# Altium footprint library Footprints.PcbLib: 196 footprints (part 7 of 13)
Each footprint in its own frame and in the unit in brackets; x right, y up, seen from the top. Pads: shape width x height; smd on the part's side, far side on the other; paste and mask are expansions set on the pad; w line width, h text height; cw(c..) or ccw(c..) is an arc to the next point about the centre after c.
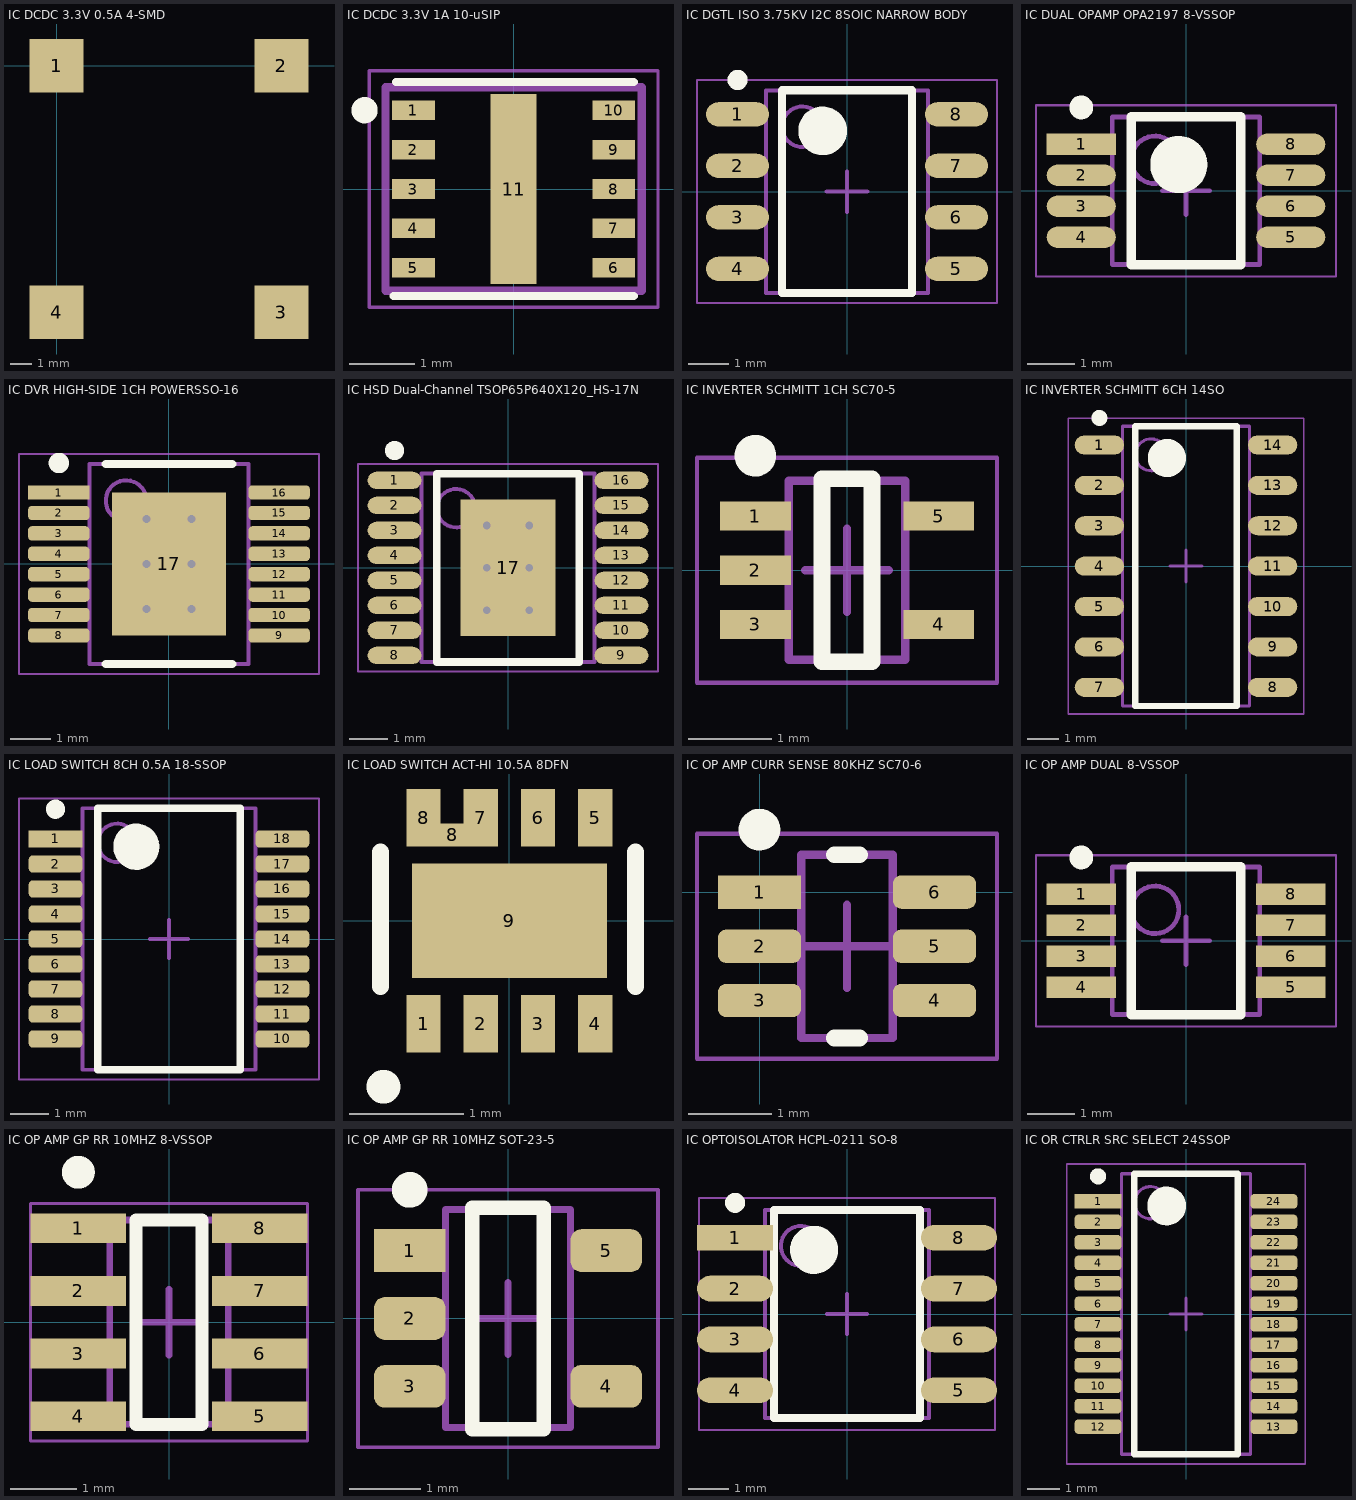
[diagram p6: the footprints below, top view; thin cyan lines are the x and y axes]

## IC DCDC 3.3V 0.5A 4-SMD [mm] "ROF-78E3.3-0.5SMD-R"
height 4
pads (4):
  rect 2.5x2.5 smd: 1(0,0) 2(10.5,0) 3(10.5,-11.5) 4(0,-11.5)
3D body: height 4, standoff 0, extent -1,-12.5 11.5,1

## IC DCDC 3.3V 1A 10-uSIP [mm] "LMZM23601"
pads (11):
  rect 0.65x0.3 smd: 1(-1.525,1.2) 2(-1.525,0.6) 3(-1.525,0) 4(-1.525,-0.6) 5(-1.525,-1.2) 6(1.525,-1.2) 7(1.525,-0.6) 8(1.525,0) 9(1.525,0.6) 10(1.525,1.2)
  rect 0.7x2.9 smd: 11(0,0)
Top Overlay:
  circle w0.2: c-2.27,1.2 r0.1
  lines w0.127: -1.83,-1.63 1.83,-1.63 ; -1.79,1.63 1.83,1.63
Top Paste:
  region: -0.35,-0.416 -0.35,0.416 0.35,0.416 0.35,-0.416
  region: 0.35,-0.617 0.35,-1.45 -0.35,-1.45 -0.35,-0.617
  region: -0.35,0.617 -0.35,1.45 0.35,1.45 0.35,0.617
Top Solder:
  region: -0.415,-1.515 -0.415,1.515 0.415,1.515 0.415,-1.515
  region: 1.135,0.985 1.135,1.415 1.915,1.415 1.915,0.985
  region: 1.135,0.385 1.135,0.815 1.915,0.815 1.915,0.385
  region: 1.135,-0.215 1.135,0.215 1.915,0.215 1.915,-0.215
  region: 1.135,-0.815 1.135,-0.385 1.915,-0.385 1.915,-0.815
  region: 1.135,-1.415 1.135,-0.985 1.915,-0.985 1.915,-1.415
  region: -1.135,-0.985 -1.135,-1.415 -1.915,-1.415 -1.915,-0.985
  region: -1.135,-0.385 -1.135,-0.815 -1.915,-0.815 -1.915,-0.385
  region: -1.135,0.215 -1.135,-0.215 -1.915,-0.215 -1.915,0.215
  region: -1.135,0.815 -1.135,0.385 -1.915,0.385 -1.915,0.815
  region: -1.135,1.415 -1.135,0.985 -1.915,0.985 -1.915,1.415
Assembly Bottom:
  lines w0.127: -1.95,-1.55 1.95,-1.55 ; -1.95,-1.55 -1.95,1.55 ; -1.95,-1.55 1.95,-1.55 ; -1.95,-1.55 -1.95,1.55 ; -1.95,1.55 1.95,1.55 ; -1.95,1.55 1.95,1.55 ; 1.95,-1.55 1.95,1.55 ; 1.95,-1.55 1.95,1.55
Mechanical 16:
  lines w0.05: -2.2,-1.8 2.2,-1.8 2.2,1.8 -2.2,1.8 -2.2,-1.8
3D body "PLMZM23601SILR--3DModel-STEP-56544.STEP": height 1.58, standoff 0, extent -1.9,-1.5 1.9,1.5

## IC DGTL ISO 3.75KV I2C 8SOIC NARROW BODY [mm] "SOIC, 8-Leads, Body 4.90x3.90mm, Pitch 1.27mm, IPC Medium Density"
height 1.75
pads (8):
  oval 1.55x0.6 smd: 1(-2.7,1.905) 2(-2.7,0.635) 3(-2.7,-0.635) 4(-2.7,-1.905) 5(2.7,-1.905) 6(2.7,-0.635) 7(2.7,0.635) 8(2.7,1.905)
Top Overlay:
  circle w0.25: c-2.7,2.755 r0.125
  circle w0.6: c-0.6,1.5 r0.3
  lines w0.2: -1.6,-2.5 -1.6,2.5 1.6,2.5 1.6,-2.5 -1.6,-2.5
Mechanical 13:
  circle w0.1: c-1.1,1.6 r0.5
  lines w0.1: -2,-2.5 -2,2.5 2,2.5 2,-2.5 -2,-2.5
Mechanical 15:
  lines w0.05: -3.7,-2.75 -3.7,2.75 3.7,2.75 3.7,-2.75 -3.7,-2.75
  lines w0.1: -0.5,0 0.5,0 ; 0,-0.5 0,0.5
3D body "IC DGTL ISO 3.75KV I2C 8SOIC NARROW BODY.step": height 1.75, standoff 0, extent -3,-2.5 3,2.5

## IC DUAL OPAMP OPA2197 8-VSSOP [mm] "TSOP, 8-Leads, Body 3.00x3.00mm, Pitch 0.65mm, IPC Medium Density"
height 1.1
pads (8):
  rect 1.45x0.45 smd: 1(-2.2,0.975)
  oval 1.45x0.45 smd: 2(-2.2,0.325) 3(-2.2,-0.325) 4(-2.2,-0.975) 5(2.2,-0.975) 6(2.2,-0.325) 7(2.2,0.325) 8(2.2,0.975)
Top Overlay:
  circle w0.6: c-0.15,0.55 r0.3
  circle w0.25: c-2.2,1.75 r0.125
  lines w0.2: -1.15,-1.55 1.15,-1.55 1.15,1.55 -1.15,1.55 -1.15,-1.55
Assembly Top:
  circle w0.1: c-0.65,0.65 r0.5
  lines w0.1: -1.55,-1.55 1.55,-1.55 1.55,1.55 -1.55,1.55 -1.55,-1.55
Courtyard Top:
  lines w0.05: -3.15,-1.8 3.15,-1.8 3.15,1.8 -3.15,1.8 -3.15,-1.8
  lines w0.1: -0.5,0 0.5,0 ; 0,-0.5 0,0.5
3D body "IC DUAL OPAMP OPA2197 8-VSSOP.step": height 1.1, standoff 0, extent -2.45,-1.55 2.45,1.55

## IC DVR HIGH-SIDE 1CH POWERSSO-16 [mm] "SSOP, 16-Leads, Body 4.90x3.90mm, Pitch 0.50mm, Thermal Pad 3.50x2.80mm, IPC Medium Density"
height 1.7
pads (17):
  rect 1.5x0.35 smd: 1(-2.7,1.75)
  rrect50% 1.5x0.35 smd: 2(-2.7,1.25) 3(-2.7,0.75) 4(-2.7,0.25) 5(-2.7,-0.25) 6(-2.7,-0.75) 7(-2.7,-1.25) 8(-2.7,-1.75) 9(2.7,-1.75) 10(2.7,-1.25) 11(2.7,-0.75) 12(2.7,-0.25) 13(2.7,0.25) 14(2.7,0.75) 15(2.7,1.25) 16(2.7,1.75)
  rect 2.8x3.5 smd: 17(0,0)
via 0.55,-1.1 diameter 0.5 hole 0.2
via -0.55,-1.1 diameter 0.5 hole 0.2
via 0.55,0 diameter 0.5 hole 0.2
via -0.55,0 diameter 0.5 hole 0.2
via 0.55,1.1 diameter 0.5 hole 0.2
via -0.55,1.1 diameter 0.5 hole 0.2
Top Overlay:
  circle w0.25: c-2.7,2.475 r0.125
  lines w0.2: -1.55,-2.45 1.55,-2.45 ; -1.55,2.45 1.55,2.45
Mechanical 13:
  circle w0.1: c-1.05,1.55 r0.5
  lines w0.1: -1.95,-2.45 1.95,-2.45 1.95,2.45 -1.95,2.45 -1.95,-2.45
Mechanical 15:
  lines w0.05: -3.675,-2.7 3.675,-2.7 3.675,2.7 -3.675,2.7 -3.675,-2.7
  lines w0.1: -0.5,0 0.5,0 ; 0,-0.5 0,0.5
3D body "IC DVR HIGH-SIDE 1CH POWERSSO-16.step": height 1.7, standoff 0, extent -3,-2.45 3,2.45

## IC HSD Dual-Channel TSOP65P640X120_HS-17N [mm] "TSOP, 16-Leads, Body 5.00x4.40mm, Pitch 0.65mm, Thermal Pad 3.55x2.46mm, IPC Medium Density"
height 1.2
pads (17):
  oval 1.4x0.45 smd: 1(-2.95,2.275) 2(-2.95,1.625) 3(-2.95,0.975) 4(-2.95,0.325) 5(-2.95,-0.325) 6(-2.95,-0.975) 7(-2.95,-1.625) 8(-2.95,-2.275) 9(2.95,-2.275) 10(2.95,-1.625) 11(2.95,-0.975) 12(2.95,-0.325) 13(2.95,0.325) 14(2.95,0.975) 15(2.95,1.625) 16(2.95,2.275)
  rect 2.46x3.55 smd: 17(0,0)
via -0.55,1.1 diameter 0.5 hole 0.2
via 0.55,1.1 diameter 0.5 hole 0.2
via -0.55,0 diameter 0.5 hole 0.2
via 0.55,0 diameter 0.5 hole 0.2
via -0.55,-1.1 diameter 0.5 hole 0.2
via 0.55,-1.1 diameter 0.5 hole 0.2
Top Overlay:
  circle w0.25: c-2.95,3.05 r0.125
  lines w0.2: -1.85,-2.45 -1.85,2.45 1.85,2.45 1.85,-2.45 -1.85,-2.45
Mechanical 13:
  circle w0.1: c-1.35,1.55 r0.5
  lines w0.1: -2.25,-2.45 -2.25,2.45 2.25,2.45 2.25,-2.45 -2.25,-2.45
Mechanical 15:
  lines w0.05: -3.9,-2.7 -3.9,2.7 3.9,2.7 3.9,-2.7 -3.9,-2.7
  lines w0.1: -0.5,0 0.5,0 ; 0,-0.5 0,0.5
3D body "TSOP65P640X120_HS-17N.step": height 1.2, standoff 0, extent -3.2,-2.45 3.2,2.45

## IC INVERTER SCHMITT 1CH SC70-5 [mm] "Inverter IC 1 Channel Schmitt Trigger SC-70-5"
height 1.1
pads (5):
  rect 0.85x0.35 smd: 1(-1.1,0.65) 2(-1.1,0) 3(-1.1,-0.65) 4(1.1,-0.65) 5(1.1,0.65)
Top Overlay:
  circle w0.25: c-1.1,1.375 r0.125
  lines w0.2: -0.3,-1.1 0.3,-1.1 0.3,1.1 -0.3,1.1 -0.3,-1.1
Assembly Top:
  lines w0.1: -0.7,-1.075 -0.7,1.075 0.7,1.075 0.7,-1.075 -0.7,-1.075
Courtyard Top:
  lines w0.05: -1.8,-1.35 -1.8,1.35 1.8,1.35 1.8,-1.35 -1.8,-1.35
  lines w0.1: -0.5,0 0.5,0 ; 0,-0.5 0,0.5
3D body "IC INVERTER SCHMITT 1CH SC70-5.step": height 1.1, standoff 0, extent -1.2,-1.075 1.2,1.075

## IC INVERTER SCHMITT 6CH 14SO [mm] "Inverter IC 6 Channel Schmitt Trigger 14-SO"
height 1.75
pads (14):
  oval 1.55x0.6 smd: 1(-2.725,3.81) 2(-2.725,2.54) 3(-2.725,1.27) 4(-2.725,0) 5(-2.725,-1.27) 6(-2.725,-2.54) 7(-2.725,-3.81) 8(2.725,-3.81) 9(2.725,-2.54) 10(2.725,-1.27) 11(2.725,0) 12(2.725,1.27) 13(2.725,2.54) 14(2.725,3.81)
Top Overlay:
  circle w0.6: c-0.6,3.4 r0.3
  circle w0.25: c-2.725,4.66 r0.125
  lines w0.2: -1.6,-4.4 1.6,-4.4 1.6,4.4 -1.6,4.4 -1.6,-4.4
Assembly Top (Mech9):
  circle w0.1: c-1.1,3.5 r0.5
  lines w0.1: -2,-4.4 2,-4.4 2,4.4 -2,4.4 -2,-4.4
Courtyard Top (Mech11):
  lines w0.05: -3.7,-4.65 3.7,-4.65 3.7,4.65 -3.7,4.65 -3.7,-4.65
  lines w0.1: -0.5,0 0.5,0 ; 0,-0.5 0,0.5
3D body "IC INVERTER SCHMITT 6CH 14SO .step": height 1.75, standoff 0, extent -3,-4.4 3,4.4

## IC LOAD SWITCH 8CH 0.5A 18-SSOP [mm] "TSOP, 18-Leads, Body 6.70x4.40mm, Pitch 0.65mm, IPC Medium Density"
height 1.55
pads (18):
  rect 1.4x0.45 smd: 1(-2.95,2.6)
  rrect50% 1.4x0.45 smd: 2(-2.95,1.95) 3(-2.95,1.3) 4(-2.95,0.65) 5(-2.95,0) 6(-2.95,-0.65) 7(-2.95,-1.3) 8(-2.95,-1.95) 9(-2.95,-2.6) 10(2.95,-2.6) 11(2.95,-1.95) 12(2.95,-1.3) 13(2.95,-0.65) 14(2.95,0) 15(2.95,0.65) 16(2.95,1.3) 17(2.95,1.95) 18(2.95,2.6)
Top Overlay:
  circle w0.25: c-2.95,3.375 r0.125
  circle w0.6: c-0.85,2.4 r0.3
  lines w0.2: -1.85,-3.4 -1.85,3.4 1.85,3.4 1.85,-3.4 -1.85,-3.4
Assembly Top:
  circle w0.1: c-1.35,2.5 r0.5
  lines w0.1: -2.25,-3.4 -2.25,3.4 2.25,3.4 2.25,-3.4 -2.25,-3.4
Courtyard Top:
  lines w0.05: -3.9,-3.65 -3.9,3.65 3.9,3.65 3.9,-3.65 -3.9,-3.65
  lines w0.1: -0.5,0 0.5,0 ; 0,-0.5 0,0.5
3D body "IC LOAD SWITCH 8CH 0.5A 18-SSOP.step": height 1.55, standoff 0, extent -3.2,-3.4 3.2,3.4

## IC LOAD SWITCH ACT-HI 10.5A 8DFN [mm]
pads (10):
  rect 0.3x0.5 smd: 1(-0.75,-0.9) 2(-0.25,-0.9) 3(0.25,-0.9) 4(0.75,-0.9) 5(0.75,0.9) 6(0.25,0.9) 7(-0.25,0.9) 8(-0.75,0.9)
  rect 0.8x0.2 smd paste+0 mask+0: 8(-0.5,0.75)
  rect 1.7x1 smd: 9(0,0)
Top Overlay:
  circle w0.254: c-1.1,-1.45 r0.02
  lines w0.15: -1.125,-0.575 -1.125,0.6 ; 1.1,-0.575 1.1,0.6
3D body "QFN50P200X200X100_HS-9N.step": height 1, standoff 0, extent -1,-1.05 1,1.05

## IC OP AMP CURR SENSE 80KHZ SC70-6 [mm]
height 1.1
pads (6):
  rect 1x0.4 smd: 1(0,0)
  rrect50% 1x0.4 smd: 2(0,-0.65) 3(0,-1.3) 4(2.1,-1.3) 5(2.1,-0.65) 6(2.1,0)
Top Overlay:
  circle w0.25: c0,0.75 r0.125
  lines w0.2: 0.9,-1.75 1.2,-1.75 ; 0.9,0.45 1.2,0.45
Mechanical 13:
  lines w0.1: 0.5,-1.75 0.5,0.45 1.6,0.45 1.6,-1.75 0.5,-1.75
Mechanical 15:
  lines w0.05: -0.75,-2 -0.75,0.7 2.85,0.7 2.85,-2 -0.75,-2
  lines w0.1: 0.55,-0.65 1.55,-0.65 ; 1.05,-1.15 1.05,-0.15
3D body "IC OP AMP CURR SENSE 80KHZ SC70-6.step": height 1.1, standoff 0, extent 0,-1.75 2.1,0.45

## IC OP AMP DUAL 8-VSSOP [mm] "VSSOP 8-Leads, Body 3.00x3.00mm, Pitch 0.65mm, IPC Medium Density"
height 1.1
pads (8):
  rect 1.45x0.45 smd: 1(-2.2,0.975) 2(-2.2,0.325) 3(-2.2,-0.325) 4(-2.2,-0.975) 5(2.2,-0.975) 6(2.2,-0.325) 7(2.2,0.325) 8(2.2,0.975)
Top Overlay:
  circle w0.25: c-2.2,1.75 r0.125
  lines w0.2: -1.15,-1.55 1.15,-1.55 1.15,1.55 -1.15,1.55 -1.15,-1.55
Mechanical 13:
  circle w0.1: c-0.65,0.65 r0.5
  lines w0.1: -1.55,-1.55 1.55,-1.55 1.55,1.55 -1.55,1.55 -1.55,-1.55
Mechanical 15:
  lines w0.05: -3.15,-1.8 3.15,-1.8 3.15,1.8 -3.15,1.8 -3.15,-1.8
  lines w0.1: -0.5,0 0.5,0 ; 0,-0.5 0,0.5
3D body: height 1.1, standoff 0.05, extent -1.55,-1.55 1.55,1.55

## IC OP AMP GP RR 10MHZ 8-VSSOP [mm] "General Purpose Amplifier 2 Circuit Rail-to-Rail 8-VSSOP"
height 1.45
pads (8):
  rect 1.45x0.45 smd: 1(-1.375,1.425) 2(-1.375,0.475) 3(-1.375,-0.475) 4(-1.375,-1.425) 5(1.375,-1.425) 6(1.375,-0.475) 7(1.375,0.475) 8(1.375,1.425)
Top Overlay:
  circle w0.25: c-1.375,2.275 r0.125
  lines w0.2: -0.5,-1.55 0.5,-1.55 0.5,1.55 -0.5,1.55 -0.5,-1.55
Mechanical 13:
  lines w0.1: -0.9,-1.55 0.9,-1.55 0.9,1.55 -0.9,1.55 -0.9,-1.55
Mechanical 15:
  lines w0.05: -2.1,-1.8 2.1,-1.8 2.1,1.8 -2.1,1.8 -2.1,-1.8
  lines w0.1: -0.5,0 0.5,0 ; 0,-0.5 0,0.5
3D body "IC OP AMP GP RR 10MHZ 8-VSSOP  .step": height 1.45, standoff 0.01, extent -1.393,-1.625 1.393,1.625

## IC OP AMP GP RR 10MHZ SOT-23-5 [mm] "SOT23, 5-Leads, Body 2.90x2.80mm, Pitch 0.95mm, IPC Medium Density"
height 1.45
pads (5):
  rect 1x0.6 smd: 1(-1.375,0.95)
  rrect50% 1x0.6 smd: 2(-1.375,0) 3(-1.375,-0.95) 4(1.375,-0.95) 5(1.375,0.95)
Top Overlay:
  circle w0.25: c-1.375,1.8 r0.125
  lines w0.2: -0.5,-1.55 -0.5,1.55 0.5,1.55 0.5,-1.55 -0.5,-1.55
Mechanical 13:
  lines w0.1: -0.875,-1.525 0.875,-1.525 0.875,1.525 -0.875,1.525 -0.875,-1.525
Mechanical 15:
  lines w0.05: -2.1,-1.8 2.1,-1.8 2.1,1.8 -2.1,1.8 -2.1,-1.8
  lines w0.1: -0.5,0 0.5,0 ; 0,-0.5 0,0.5
3D body "IC OP AMP GP RR 10MHZ SOT-23-5.step": height 1.45, standoff 0, extent -1.5,-1.525 1.5,1.525

## IC OPTOISOLATOR HCPL-0211 SO-8 [mm] "SOIC, 8-Leads, Body 5.08x3.94mm, Pitch 1.27mm, IPC Medium Density"
height 3.2
pads (8):
  rect 1.9x0.64 smd: 1(-2.795,1.905)
  oval 1.9x0.64 smd: 2(-2.795,0.635) 3(-2.795,-0.635) 4(-2.795,-1.905) 5(2.795,-1.905) 6(2.795,-0.635) 7(2.795,0.635) 8(2.795,1.905)
Top Overlay:
  circle w0.6: c-0.825,1.6 r0.3
  circle w0.25: c-2.795,2.775 r0.125
  lines w0.2: -1.825,-2.6 1.825,-2.6 1.825,2.6 -1.825,2.6 -1.825,-2.6
Assembly Top:
  circle w0.1: c-1.15,1.7 r0.5
  lines w0.1: -2.05,-2.6 2.05,-2.6 2.05,2.6 -2.05,2.6 -2.05,-2.6
Courtyard Top:
  lines w0.05: -3.7,-2.9 3.7,-2.9 3.7,2.9 -3.7,2.9 -3.7,-2.9
  lines w0.1: -0.5,0 0.5,0 ; 0,-0.5 0,0.5
3D body "IC OPTOISOLATOR HCPL-0211 SO-8.step": height 3.2, standoff 0, extent -2.997,-2.6 2.997,2.6

## IC OR CTRLR SRC SELECT 24SSOP [mm] "LTC4417"
height 1.75
pads (24):
  rect 1.45x0.45 smd: 1(-2.725,3.492)
  rrect50% 1.45x0.45 smd: 2(-2.725,2.857) 3(-2.725,2.222) 4(-2.725,1.587) 5(-2.725,0.953) 6(-2.725,0.318) 7(-2.725,-0.318) 8(-2.725,-0.953) 9(-2.725,-1.587) 10(-2.725,-2.222) 11(-2.725,-2.857) 12(-2.725,-3.492) 13(2.725,-3.492) 14(2.725,-2.857) 15(2.725,-2.222) 16(2.725,-1.587) 17(2.725,-0.953) 18(2.725,-0.318) 19(2.725,0.318) 20(2.725,0.953) 21(2.725,1.587) 22(2.725,2.222) 23(2.725,2.857) 24(2.725,3.492)
Top Overlay:
  circle w0.25: c-2.725,4.267 r0.125
  circle w0.6: c-0.6,3.35 r0.3
  lines w0.2: -1.6,-4.35 -1.6,4.35 1.6,4.35 1.6,-4.35 -1.6,-4.35
Mechanical 13:
  circle w0.1: c-1.1,3.45 r0.5
  lines w0.1: -2,-4.35 -2,4.35 2,4.35 2,-4.35 -2,-4.35
Mechanical 15:
  lines w0.05: -3.7,-4.65 -3.7,4.65 3.7,4.65 3.7,-4.65 -3.7,-4.65
  lines w0.1: -0.5,0 0.5,0 ; 0,-0.5 0,0.5
3D body "IC OR CTRLR SRC SELECT 24SSOP.step": height 1.75, standoff 0, extent -3.004,-4.35 3.004,4.35